# Altium footprint library Cty1.PcbLib: 1378 footprints (part 65 of 87)
Each footprint in its own frame and in the unit in brackets; x right, y up, seen from the top. Pads: shape width x height; smd on the part's side, far side on the other; paste and mask are expansions set on the pad; w line width, h text height; cw(c..) or ccw(c..) is an arc to the next point about the centre after c.
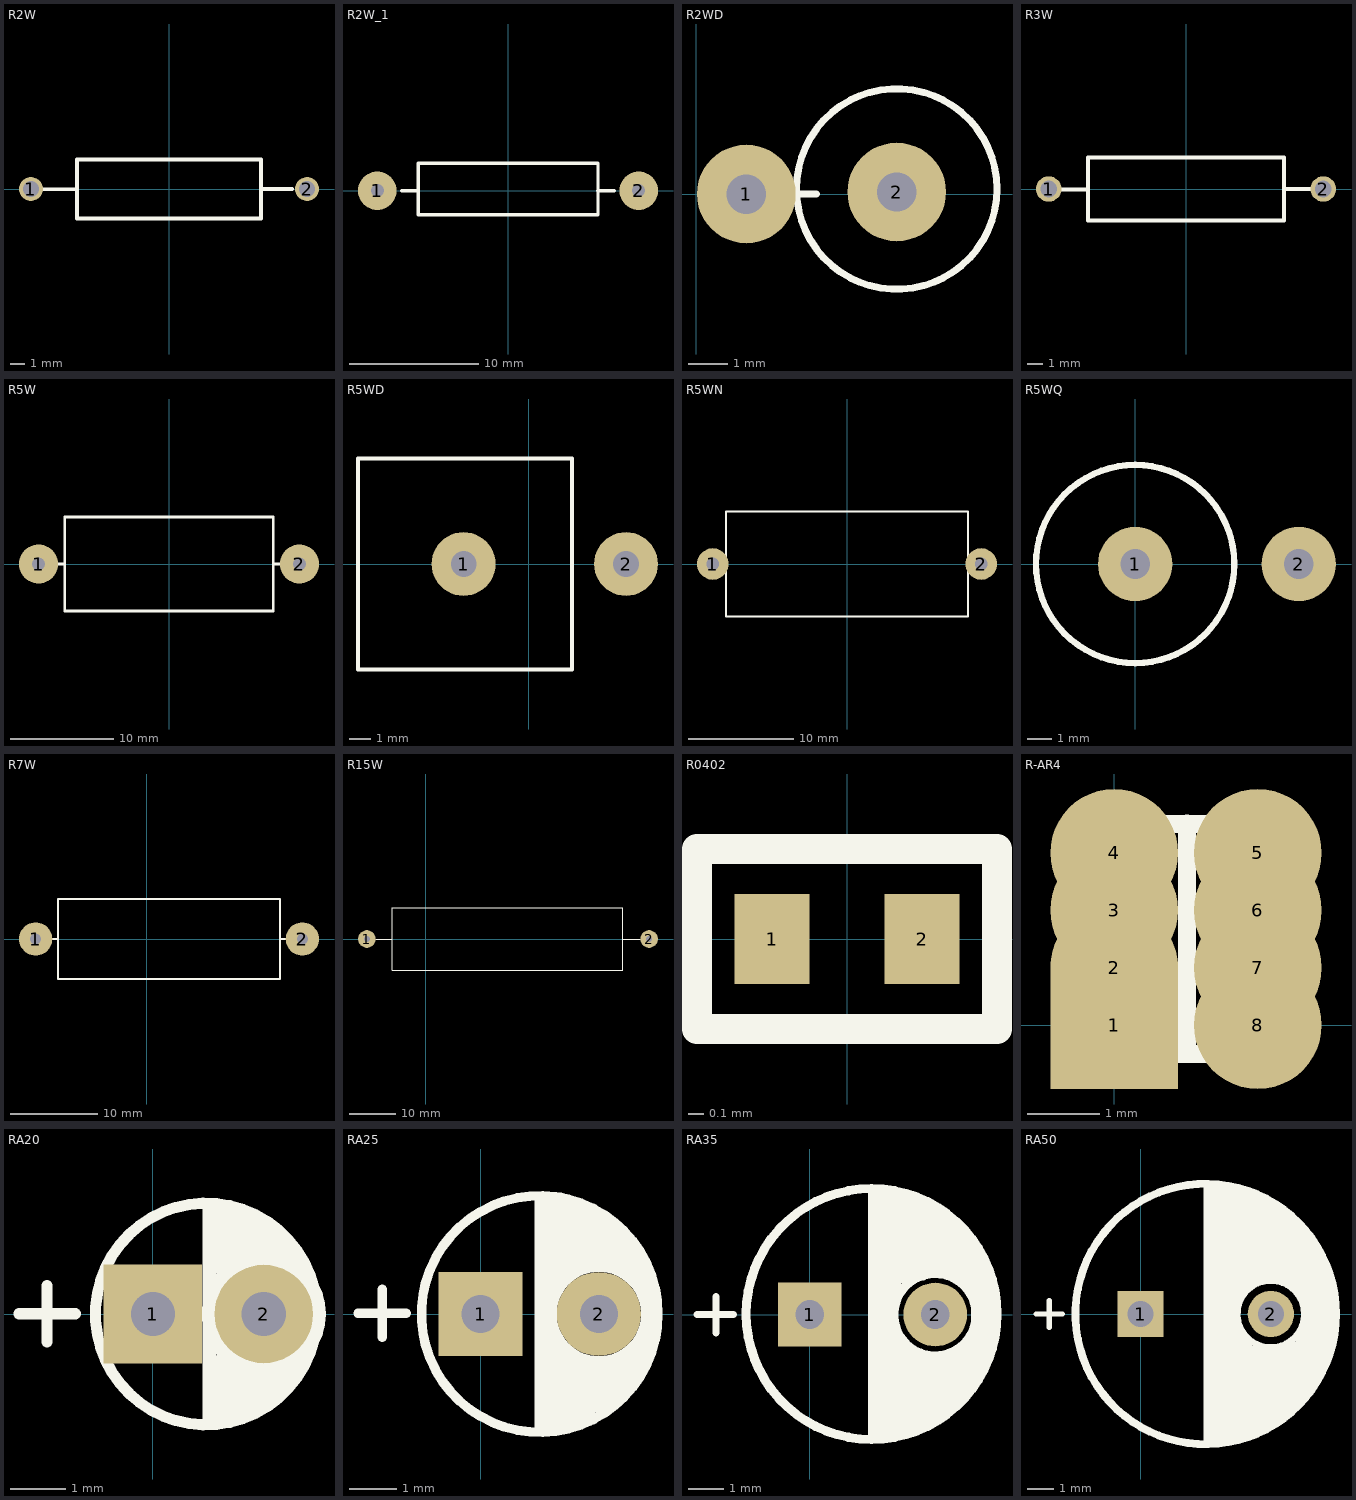
[diagram p64: the footprints below, top view; thin cyan lines are the x and y axes]

## R2W [mil] "dien tro 2W"
height 10
pads (2):
  round 65 hole 43.31: 1(-375,0) 2(375,0)
Top Overlay:
  lines w10: -340,-1 -250,-1 -250,-80 250,-80 250,80 -250,80 -250,0 -251,-1 ; 250,0 335,0
3D body "User Library-Resistor Vishay AC052.STEP": height 307.09, standoff -132.33, extent -390.74,-110.23 390.76,110.24

## R2W_1 [mm]
pads (2):
  round 3 hole 1.016: 1(-10.16,0) 2(10.16,0)
Top Overlay:
  lines w0.25: -5.5,-1.873 6.985,-1.873 6.985,2.127 -5.5,2.127
  lines w0.254: -8.255,0 -6.985,0 ; -5.5,-1.873 -6.985,-1.873 -6.985,2.127 -5.5,2.127 ; 6.985,0 8.255,0
3D body "AXIAL08-3D.STEP": height 4.57, standoff -2.54, extent -10.414,-1.905 10.414,2.159

## R2WD [mm] "R2W, 2 pin, 700mil"
height 5.08
pads (2):
  round 2.5 hole 1: 1(1.27,0) 2(5.08,0.051)
Top Overlay:
  circle w0.178: c5.08,0.127 r2.54
  lines w0.178: 2.159,0 3.048,0
3D body "User Library-Res_Stand.STEP": height 16.25, standoff -2.71, extent 1.02,-2.936 8.015,2.942

## R3W [mil] "dien tro 3W"
pads (2):
  round 65 hole 43.31: 1(-350,0) 2(350,0)
Top Overlay:
  lines w10: -321,-1 -250,-1 -250,-80 250,-80 250,80 -250,80 -250,0 -251,-1 ; 250,0 320,0
3D body "User Library-Resistor Vishay AC05.STEP": height 314.96, standoff -132.33, extent -365.74,-118.1 365.75,118.11

## R5W [mm] "dien tro 5W"
pads (2):
  round 3.81 hole 1.27: 1(-12.7,0) 2(12.7,0)
Top Overlay:
  lines w0.254: -11.811,0 -10.16,0 ; 10.16,0 11.684,0 ; -10.16,-4.572 10.16,-4.572 10.16,4.572 -10.16,4.572 -10.16,-4.572
3D body "User Library-Resistor Vishay AC053.STEP": height 10, standoff -3.36, extent -13.1,-4.92 13.1,5.08

## R5WD [mm] "R5W , 2 pin, 300 x 600 mil"
height 10.16
pads (2):
  round 3 hole 1.2: 1(-3.048,0) 2(4.572,0)
Top Overlay:
  lines w0.178: -8.001,-4.953 -8.001,4.953 2.032,4.953 2.032,-4.953 -8.001,-4.953
3D body "SW3dPS-5W Res.STEP": height 23.05, standoff -2.4, extent -8.001,-5 5.079,5

## R5WN [mm]
pads (2):
  round 3 hole 1.2 paste+5: 1(-12.75,0) 2(12.75,0)
Top Overlay:
  lines w0.2: -11.5,-5 11.5,-5 11.5,5 -11.5,5 -11.5,-5
3D body "AXIAL10-3D.STEP": height 8.89, standoff -2.54, extent -13.081,-5 13.081,5.16

## R5WQ [mm] "R5W , 2 pin, 300 x 600 mil"
height 10.16
pads (2):
  round 3 hole 1.2: 1(0,0) 2(6.604,0)
Top Overlay:
  circle w0.254: c0,0 r4
3D body "User Library-Resistor_PTH_AC05_Vishay_5W_Vertical.STEP": height 21.4, standoff -4.6, extent -3.75,-3.75 6.9,3.75

## R7W [mm] "dien tro 5W"
pads (2):
  round 3.81 hole 1.27: 1(-12.7,0) 2(17.78,0)
Top Overlay:
  lines w0.254: -11.811,0 -10.16,0 ; 15.24,0 17.78,0 ; -10.16,-4.572 -10.16,4.572 15.24,4.572 15.24,-4.572 -10.16,-4.572
3D body "SW3dPS-PRWC7W.STEP": height 10.51, standoff -2.36, extent -13.077,-4.5 18.154,4.5

## R15W [mm] "dien tro 5W"
pads (2):
  round 3.81 hole 1.27: 1(-12.7,0) 2(48.26,0)
Top Overlay:
  lines w0.254: -10.795,0 -7.239,0 ; 42.545,0 46.355,0 ; -7.239,-6.731 -7.239,6.731 42.545,6.731 42.545,-6.731 -7.239,-6.731
3D body "User Library-Resistor CR15.STEP": height 16.5, standoff -2.75, extent -13.081,-6.755 48.596,6.755

## R0402 [mm]
pads (2):
  rect 0.5x0.6 smd: 1(-0.5,0) 2(0.5,0)
Top Overlay:
  lines w0.2: -1,-0.6 -1,0.6 1,0.6 1,-0.6 -1,-0.6
Mechanical 16:
  lines w0.15: -1,-0.6 1,-0.6 1,0.6 -1,0.6 -1,-0.6
Mechanical 29:
  text ".Designator" at -0.7,-0.2 h0.4
3D body "R0402.step": height 0.4, standoff 0, extent -0.5,-0.25 0.5,0.25

## R-AR4 [mil]
pads (8):
  rect 70x70 smd: 1(0,0)
  round 70 smd: 2(0,31.5) 3(0,62.99) 4(0,94.49) 5(78.74,94.49) 6(78.74,62.99) 7(78.74,31.5) 8(78.74,0)
Top Overlay:
  lines w10: 18.49,-15.75 62.99,-15.75 ; 19.68,110.24 59.05,110.24 ; 39.85,-15.39 39.85,110.59

## RA20 [mil]
pads (2):
  rect 70x70 hole 31.5 unplated: 1(0,0)
  round 70 hole 31.5 unplated: 2(78.74,0)
Top Overlay:
  circle w7.87: c37.86,0 r78.74
  circle w10: c78.74,0 r39.24
  lines w7.87: -95.2,0.2 -55.2,0.2 ; -75.2,-19.8 -75.2,20.2
  lines w10: 88.6,-56.4 88.6,-44 ; 95.4,-48.2 95.4,-44 88.6,-44 ; 100,46.4 100,38.6 90.8,38.6 90.8,55.8 85.6,55.8 85.6,44.2 78.2,44.2 78.2,64.6 71,64.6 71,39.4 63,39.4 63,71.8 55,71.8 55,33.2 48,33.2 48,76.4 40.2,76.4 40.2,-73.6 49.2,-73.6 49.2,-32.6 55.6,-32.6 55.6,-70.2 64.4,-70.2 64.4,-41.8 72.4,-41.8 72.4,-64.8 80.4,-64.8 80.4,-44 88.6,-44 ; 101.2,-36.4 101.2,-44 97.2,-44 88.6,-44

## RA25 [mil]
pads (2):
  rect 70x70 hole 31.5 unplated: 1(0,0)
  round 70 hole 31.5 unplated: 2(98.42,0)
Top Overlay:
  circle w10: c98.43,0 r40.03
  circle w7.87: c49.21,0 r98.43
  lines w7.87: -101.96,0.6 -61.96,0.6 ; -81.96,-19.4 -81.96,20.6
  lines w10: 49.8,96 49.8,-96 58.6,-96 58.6,96 66.4,96 66.4,32.6 ; 58.6,-26 66.2,-26 66.2,-92.8 75.4,-92.8 75.4,-38.6 83.4,-38.6 83.4,-88.2 90.4,-88.2 90.4,-44.6 99.6,-44.6 99.6,-79.6 105,-79.6 105,-42.2 112.8,-42.2 112.8,-69.6 ; 66.4,88.8 74.8,88.8 74.8,37.6 82.2,37.6 82.2,87.8 90.2,87.8 90.2,43 98.8,43 98.8,80.2 103.2,80.2 103.2,44.2 111.4,44.2 111.4,71.4 114.6,71.4 114.6,38.2 122.2,38.2 122.2,60.4 125,60.4 125,30.6 130.6,30.6 130.6,48.4 ; 118.2,-35.6 121.8,-35.6 121.8,-63.2 ; 128.8,-27.6 130,-27.6 130,-50.8 ; 136.8,-18.2 138.6,-18.2 ; 136.8,20.4 138.8,20.4 ; 138.46,0 138.46,-18.2 138.6,-18.2 ; 138.6,-35.6 138.6,-18.2 ; 138.8,36.6 138.8,20.4 ; 140,-5.4 140,20.4 138.8,20.4

## RA35 [mil]
pads (2):
  rect 70x70 hole 31.5 unplated: 1(0,0)
  round 70 hole 31.5 unplated: 2(137.8,0)
Top Overlay:
  circle w10: c67.8,0.6 r137.8
  circle w10: c137.48,-0.2 r45.32
  lines w7.87: -124,0 -84,0 ; -103.15,-20 -103.15,20
  lines w10: 68.8,136.8 68.8,-133.4 78.4,-133.4 78.4,134.2 87.4,134.2 87.4,-133 94.6,-133 94.6,-26.8 100.8,-26.8 100.8,-129 109,-129 109,-43.4 116.2,-43.4 116.2,-124.2 124,-124.2 124,-48.8 131.6,-48.8 ; 95.4,21.4 95.4,135.2 ; 95.4,128.6 103.8,128.6 103.8,38 110.2,38 110.2,127.2 117.6,127.2 117.6,42.4 124.2,42.4 124.2,124 ; 131.6,-118.4 131.6,-48.8 ; 133.2,45.8 130.2,45.8 130.2,117.8 136,117.8 136,46.4 143,46.4 143,111.4 147,111.4 147,47.2 154.8,47.2 154.8,102.6 157.4,102.6 157.4,43 164.8,43 164.8,95.8 164.8,36.8 174.4,36.8 174.4,85.4 ; 139,-49.2 147,-49.2 147,-106.6 153.2,-106.6 153.2,-46.6 159.8,-46.6 159.8,-98.6 ; 140.4,-112.8 140.4,-48.8 131.6,-48.8 ; 162,-38.6 167,-38.6 ; 167,-87.4 167,-38.6 ; 174,-30.6 174,-38.6 175.6,-38.6 ; 174.4,31 182.2,31 ; 175.6,-80 175.6,-38.6 ; 175.6,-69 182.2,-69 182.2,69.8 185,69.8 185,-56.2 190.8,-56.2 190.8,51.4 193.8,51.4 193.8,-37.2 198.6,-37.2 198.6,29.4 ; 167,-38.6 175.6,-38.6

## RA50 [mil]
pads (2):
  rect 70x70 hole 39.37 unplated: 1(0,0)
  round 70 hole 39.37 unplated: 2(196.85,0)
Top Overlay:
  circle w11.81: c98.43,0 r196.85
  rectangle: 154,-42 162,-34
  rectangle: 144,-42 154,-26
  rectangle: 144,-48 168,-42
  rectangle: 238,30 242,38
  rectangle: 230,38 242,44
  rectangle: 242,22 250,44
  rectangle: 220,44 250,52
  rectangle: 144,26 154,34
  rectangle: 144,34 164,44
  rectangle: 142,42 174,50
  rectangle: 236,-38 244,-28
  rectangle: 244,-38 247.53,-22
  rectangle: 234,-42 247.53,-38
  rectangle: 224,-50 247.53,-42
  rectangle: 278,-68 286,-48
  rectangle: 270,-88 278,-48
  rectangle: 272,50 282,78
  rectangle: 196,156 210,164
  rectangle: 184,156 196,172
  rectangle: 174,156 184,178
  rectangle: 160,156 174,182
  rectangle: 142,156 160,184
  rectangle: 142,148 220,156
  rectangle: 142,138 230,148
  rectangle: 142,128 240,138
  rectangle: 142,118 250,128
  rectangle: 142,108 256,118
  rectangle: 142,100 262,108
  rectangle: 142,88 268,100
  rectangle: 247.53,-50 290,54
  rectangle: 262,-102 270,-90
  rectangle: 254,-112 262,-90
  rectangle: 246,-122 254,-90
  rectangle: 238,-132 246,-90
  rectangle: 230,-140 238,-90
  rectangle: 218,-152 230,-90
  rectangle: 206,-160 218,-90
  rectangle: 190,-168 206,-90
  rectangle: 172,-176 190,-90
  rectangle: 144,-186 172,-90
  rectangle: 144,-90 270,-48
  rectangle: 142,50 272,88
  rectangle: 110,-192 148,192
  lines w7.87: -158,0 -118,0 ; -138,-20 -138,20
  lines w10: 100,194 100,-196 108,-196 108,190 ; 247.5,-1.71 cw(c196.85,0) 247.53,0